# Altium footprint library Miscellaneous THD.PcbLib: 216 footprints (part 5 of 15)
Each footprint in its own frame and in the unit in brackets; x right, y up, seen from the top. Pads: shape width x height; smd on the part's side, far side on the other; paste and mask are expansions set on the pad; w line width, h text height; cw(c..) or ccw(c..) is an arc to the next point about the centre after c.
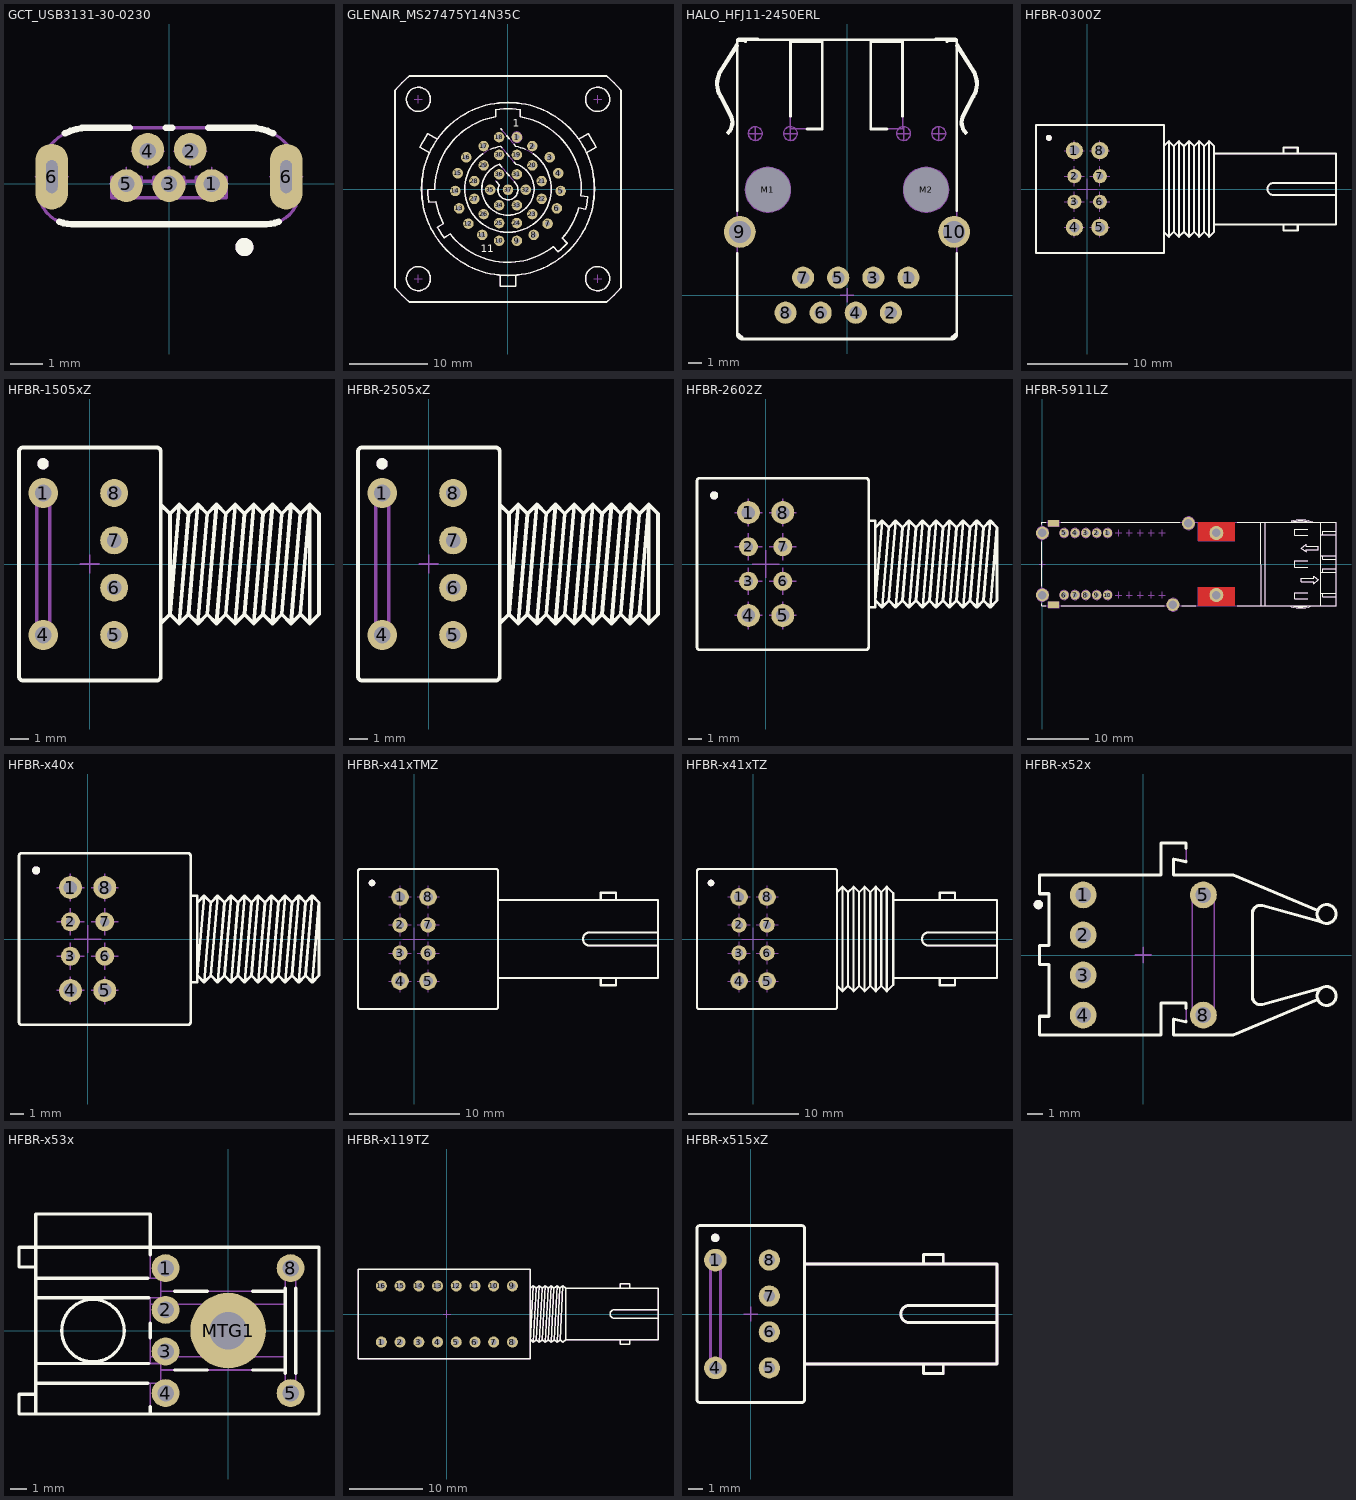
[diagram p4: the footprints below, top view; thin cyan lines are the x and y axes]

## GCT_USB3131-30-0230 [mm] "USB 2.0 Type B Receptacle, Vertical, 5 Contacts, Pins 1.5mm long"
height 5.6
pads (7):
  round 1 hole 0.5 copper offset 0,-0.05: 1(1.3,0) 3(0,0) 5(-1.3,0)
  round 1 hole 0.5 copper offset 0,0.05: 2(0.65,1) 4(-0.65,1)
  oval 1x2 hole 0.35 slot 1 at 90 deg: 6(-3.575,0.22) 6(3.575,0.22)
Top Overlay:
  circle w0.35: c2.3,-1.926 r0.1
  lines w0.2: -3.347,-1.152 ccw(c-2.972,-0.224) -2.972,-1.224 2.971,-1.224 ccw(c2.971,-0.224) 3.346,-1.152 ; -3.176,1.54 cw(c-2.472,0.216) -2.472,1.716 -1.2,1.716 ; -0.1,1.716 0.1,1.716 ; 1.2,1.716 2.471,1.716 cw(c2.471,0.216) 3.176,1.54
Mechanical 8:
  circle w0.05: c-1.3,0 r0.2
  circle w0.05: c0,0 r0.2
  circle w0.05: c1.3,0 r0.2
  circle w0.05: c0.65,1 r0.2
  circle w0.05: c-0.65,1 r0.2
  lines w0.05: -4.075,0.22 -3.575,0.22 ; -3.575,-0.28 -3.575,0.22 ; -3.575,0.72 -3.575,0.22 ; -3.075,0.22 -3.575,0.22 ; -1.8,0 -1.3,0 ; -1.3,-0.5 -1.3,0 ; -1.3,0.5 -1.3,0 ; -1.15,1 -0.65,1 ; -0.8,0 -1.3,0 ; -0.65,0.5 -0.65,1 ; -0.65,1.5 -0.65,1 ; -0.5,0 0,0 ; -0.15,1 -0.65,1 ; 0,-0.5 0,0 ; 0,0.5 0,0 ; 0.15,1 0.65,1 ; 0.5,0 0,0 ; 0.65,0.5 0.65,1 ; 0.65,1.5 0.65,1 ; 0.8,0 1.3,0 ; 1.15,1 0.65,1 ; 1.3,-0.5 1.3,0 ; 1.3,0.5 1.3,0 ; 1.8,0 1.3,0 ; 3.075,0.22 3.575,0.22 ; 3.575,-0.28 3.575,0.22 ; 3.575,0.72 3.575,0.22 ; 4.075,0.22 3.575,0.22 ; -3.75,-0.28 ccw(c-3.575,-0.28) -3.4,-0.28 -3.4,0.72 ccw(c-3.575,0.72) -3.75,0.72 -3.75,-0.28 ; 3.4,-0.28 ccw(c3.575,-0.28) 3.75,-0.28 3.75,0.72 ccw(c3.575,0.72) 3.4,0.72 3.4,-0.28
  lines w0.1: -0.5,0 0,0 ; 0,-0.5 0,0 ; 0,0.5 0,0 ; 0.5,0 0,0
Mechanical 14:
  circle w0.35: c2.3,-1.926 r0.1
  lines w0.1: -3.972,-0.224 ccw(c-2.972,-0.224) -2.972,-1.224 2.971,-1.224 ccw(c2.971,-0.224) 3.971,-0.224 3.971,0.216 ccw(c2.471,0.216) 2.471,1.716 -2.472,1.716 ccw(c-2.472,0.216) -3.972,0.216 -3.972,-0.224 ; -1.75,-0.425 1.75,-0.425 1.75,0.2 1.485,0.2 1.485,0.077 1.113,0.077 1.113,0.2 0.824,0.2 0.824,0.077 0.453,0.077 0.453,0.2 0.188,0.2 0.188,0.077 -0.184,0.077 -0.184,0.2 -0.473,0.2 -0.473,0.077 -0.845,0.077 -0.845,0.2 -1.119,0.2 -1.119,0.077 -1.49,0.077 -1.49,0.2 -1.75,0.2 -1.75,-0.425
3D body "GCT_USB3131-0230.stp": height 5.61, standoff -2.3, extent -3.972,-1.223 3.971,1.709

## GLENAIR_MS27475Y14N35C [mm] "37 Contacts, Wall Mount Hermetic Ultraminiature Circular Receptacle MIL-DTL-38999 Series II"
height 20.85
pads (37):
  round 1.35 hole 0.65: 1(1.143,6.655) 2(3.124,5.512) 3(5.359,4.064) 4(6.452,2.032) 5(6.756,-0.254) 6(6.274,-2.489) 7(5.08,-4.445) 8(3.302,-5.893) 9(1.143,-6.655) 10(-1.143,-6.655) 11(-3.302,-5.893) 12(-5.08,-4.445) 13(-6.274,-2.489) 14(-6.756,-0.254) 15(-6.452,2.032) 16(-5.359,4.064) 17(-3.124,5.512) 18(-1.143,6.655) 19(1.143,4.369) 20(3.124,3.023) 21(4.318,1.016) 22(4.318,-1.27) 23(3.124,-3.226) 24(1.143,-4.369) 25(-1.143,-4.369) 26(-3.124,-3.227) 27(-4.318,-1.27) 28(-4.318,1.016) 29(-3.124,3.023) 30(-1.143,4.369) 31(1.143,1.88) 32(2.286,-0.102) 33(1.143,-2.083) 34(-1.143,-2.083) 35(-2.286,-0.102) 36(-1.143,1.88) 37(0,-0.102)
Top Overlay:
  circle w0.2: c-11.5,-11.5 r1.55
  circle w0.2: c11.5,-11.5 r1.55
  circle w0.2: c11.5,11.5 r1.55
  circle w0.2: c-11.5,11.5 r1.55
  circle w0.2: c0,0 r11.1
  lines w0.2: -10.074,4.661 -11.291,5.364 cw(c0,0) -10.291,7.096 -9.074,6.393 ; -3.231,4.518 ccw(c0,0) 3.231,4.518 ; -2.216,5.093 cw(c0,0) -0.944,5.473 -0.804,5.31 ; -1.482,0.939 -1.126,0.522 ccw(c0,-0.102) 0.965,0.751 ; -1,-11.055 -1,-12.46 ccw(c0,0) 1,-12.46 1,-11.055 ; -0.944,7.748 -0.817,7.6 ; -0.804,2.82 -1.104,3.171 ccw(c0,0) 0.992,3.208 0.804,3.428 ; -0.161,2.068 0.161,1.691 ; -0.161,4.557 0.161,4.181 ; -0.158,6.829 0.164,6.452 ; 0.791,5.719 1.011,5.461 cw(c0,0) 2.216,5.093 ; 0.804,0.939 0.992,0.719 ; 9.074,6.393 10.291,7.096 cw(c0,0) 11.291,5.364 10.074,4.661 ; -14.5,-12.661 ccw(c0,0) -12.661,-14.5 12.661,-14.5 ccw(c0,0) 14.5,-12.661 14.5,12.661 ccw(c0,0) 12.661,14.5 -12.661,14.5 ccw(c0,0) -14.5,12.661 -14.5,-12.661 ; -10.3,-0.098 ccw(c0,0) -10.16,-1.692 -9.261,-1.613 ccw(c0,0) -8.291,-4.43 -9.048,-4.922 ccw(c0,0) -8.176,-6.264 -7.419,-5.772 ccw(c0,0) 5.802,-7.395 6.418,-8.056 ccw(c0,0) 7.588,-6.965 6.973,-6.304 ccw(c0,0) 9.085,-2.414 9.974,-2.571 ccw(c0,0) 10.252,-0.995 9.363,-0.839 ccw(c0,0) 1.6,9.263 1.6,10.175 ccw(c0,0) -1.6,10.175 -1.6,9.263 ccw(c0,0) -9.4,-0.019 -10.3,-0.098
  text "1" at 0.626,7.957 h1
  text "11" at -3.476,-8.104 h1
Mechanical 8:
  drawing of 165 lines, arcs and shapes, not listed
Mechanical 14:
  circle w0.1: c0,0 r11.1
  circle w0.1: c-11.5,-11.5 r1.55
  circle w0.1: c11.5,-11.5 r1.55
  circle w0.1: c11.5,11.5 r1.55
  circle w0.1: c-11.5,11.5 r1.55
  circle w0.1: c1.143,6.655 r0.675
  lines w0.1: -10.074,4.661 -11.291,5.364 cw(c0,0) -10.291,7.096 -9.074,6.393 ; -1.621,1.101 -1.126,0.522 ccw(c0,-0.102) 0.965,0.751 ; -1,-11.055 -1,-12.46 ccw(c0,0) 1,-12.46 1,-11.055 ; -0.944,7.748 1.011,5.461 cw(c0,0) -0.944,5.473 0.992,3.208 cw(c0,0) -1.104,3.171 0.992,0.719 ; 9.074,6.393 10.291,7.096 cw(c0,0) 11.291,5.364 10.074,4.661 ; -14.5,-12.661 ccw(c0,0) -12.661,-14.5 12.662,-14.5 ccw(c0,0) 14.5,-12.661 14.5,12.661 ccw(c0,0) 12.662,14.5 -12.661,14.5 ccw(c0,0) -14.5,12.661 -14.5,-12.661 ; -10.299,-0.098 ccw(c0,0) -10.16,-1.692 -9.26,-1.613 ccw(c0,0) -8.291,-4.43 -9.048,-4.922 ccw(c0,0) -8.176,-6.264 -7.419,-5.772 ccw(c0,0) 5.802,-7.395 6.418,-8.056 ccw(c0,0) 7.588,-6.965 6.973,-6.304 ccw(c0,0) 9.085,-2.414 9.974,-2.571 ccw(c0,0) 10.252,-0.995 9.363,-0.839 ccw(c0,0) 1.6,9.263 1.6,10.175 ccw(c0,0) -1.6,10.175 -1.6,9.263 ccw(c0,0) -9.4,-0.019 -10.299,-0.098
  text "11" at -3.476,-8.104 h1
  text "1" at 0.626,7.957 h1
  text "31" at -0.693,3.169 h1
3D body "GLENAIR_MS27475Y14N35C.stp": height 20.2, standoff -1.27, extent -14.5,-14.5 14.5,14.5

## HALO_HFJ11-2450ERL [mm] "1 Port, 1x1 Tab-Down 10/100BASE-TX RJ45, FastJack Connector Module Without LED"
height 14.72
pads (12):
  round 1.6 hole 0.9: 1(4.445,1.27) 2(3.175,-1.27) 3(1.905,1.27) 4(0.635,-1.27) 5(-0.635,1.27) 6(-1.905,-1.27) 7(-3.175,1.27) 8(-4.445,-1.27)
  round 2.3 hole 1.6: 9(-7.745,4.57) 10(7.745,4.57)
  round 1 hole 3.25 unplated mask+1.125: M1(-5.715,7.62) M2(5.715,7.62)
Top Overlay:
  lines w0.2: -7.94,-2.749 -7.59,-3.02 -7.59,-3.17 ; -7.94,3.032 -7.94,-2.82 ccw(c-7.59,-2.82) -7.59,-3.17 ; -7.94,6.108 -7.94,18.42 -7.33,18.42 ; -7.939,18.188 -9.093,16.376 ccw(c-7.575,15.295) -9.181,14.35 -8.461,12.99 cw(c-9.381,12.499) -8.638,11.767 -8.567,11.696 ccw(c-9.381,12.499) -8.372,13.037 -9.094,14.399 cw(c-7.575,15.295) -9.01,16.32 -7.914,18.042 ; -7.931,18.42 cw(c-7.79,18.37) -7.79,18.52 -6.46,18.52 -6.46,18.47 ; -7.84,-2.827 ccw(c-7.59,-2.82) -7.59,-3.07 ; -7.33,18.32 -7.33,18.52 ; -7.33,18.473 7.23,18.47 ; -4.085,12.93 -4.085,18.32 -1.785,18.32 -1.785,12.021 -2.887,12.021 ; 1.715,18.318 4.015,18.32 4.015,12.928 ; 1.715,18.32 1.715,12.02 2.887,12.02 ; 6.401,18.47 6.401,18.52 7.79,18.52 cw(c7.79,18.37) 7.931,18.42 ; 7.23,18.32 7.23,18.52 ; 7.23,18.42 7.94,18.42 7.94,6.108 ; 7.59,-3.07 ccw(c7.59,-2.82) 7.84,-2.827 ; 7.914,18.042 9.01,16.32 cw(c7.575,15.295) 9.094,14.399 8.372,13.037 ccw(c9.381,12.499) 8.567,11.696 8.638,11.767 cw(c9.381,12.499) 8.461,12.99 9.181,14.35 ccw(c7.575,15.295) 9.093,16.376 7.939,18.188 ; 7.94,-2.749 7.59,-3.02 7.59,-3.17 ; 7.94,3.032 7.94,-2.82 cw(c7.59,-2.82) 7.59,-3.17 ; -7.59,-3.17 7.59,-3.17
Mechanical 8:
  circle w0.1: c-7.745,4.57 r0.8
  circle w0.1: c7.745,4.57 r0.8
  circle w0.1: c5.715,7.62 r1.625
  circle w0.1: c-5.715,7.62 r1.625
  circle w0.1: c-6.63,11.68 r0.5
  circle w0.1: c-4.09,11.68 r0.5
  circle w0.1: c4.09,11.68 r0.5
  circle w0.1: c6.63,11.68 r0.5
  circle w0.1: c4.445,1.27 r0.45
  circle w0.1: c1.905,1.27 r0.45
  circle w0.1: c-0.635,1.27 r0.45
  circle w0.1: c-3.175,1.27 r0.45
  circle w0.1: c3.175,-1.27 r0.45
  circle w0.1: c0.635,-1.27 r0.45
  circle w0.1: c-1.905,-1.27 r0.45
  circle w0.1: c-4.445,-1.27 r0.45
  lines w0.1: -8.245,4.57 -7.745,4.57 ; -7.745,4.07 -7.745,4.57 ; -7.745,5.07 -7.745,4.57 ; -7.245,4.57 -7.745,4.57 ; -7.13,11.68 -6.63,11.68 ; -6.63,11.18 -6.63,11.68 ; -6.63,12.18 -6.63,11.68 ; -6.215,7.62 -5.715,7.62 ; -6.13,11.68 -6.63,11.68 ; -5.715,7.12 -5.715,7.62 ; -5.715,8.12 -5.715,7.62 ; -5.215,7.62 -5.715,7.62 ; -4.945,-1.27 -4.445,-1.27 ; -4.59,11.68 -4.09,11.68 ; -4.445,-1.77 -4.445,-1.27 ; -4.445,-0.77 -4.445,-1.27 ; -4.09,11.18 -4.09,11.68 ; -4.09,12.18 -4.09,11.68 ; -3.945,-1.27 -4.445,-1.27 ; -3.675,1.27 -3.175,1.27 ; -3.59,11.68 -4.09,11.68 ; -3.175,0.77 -3.175,1.27 ; -3.175,1.77 -3.175,1.27 ; -2.675,1.27 -3.175,1.27 ; -2.405,-1.27 -1.905,-1.27 ; -1.905,-1.77 -1.905,-1.27 ; -1.905,-0.77 -1.905,-1.27 ; -1.405,-1.27 -1.905,-1.27 ; -1.135,1.27 -0.635,1.27 ; -0.635,0.77 -0.635,1.27 ; -0.635,1.77 -0.635,1.27 ; -0.5,0 0,0 ; -0.135,1.27 -0.635,1.27 ; 0,-0.5 0,0 ; 0,0.5 0,0 ; 0.135,-1.27 0.635,-1.27 ; 0.5,0 0,0 ; 0.635,-1.77 0.635,-1.27 ; 0.635,-0.77 0.635,-1.27 ; 1.135,-1.27 0.635,-1.27 ; 1.405,1.27 1.905,1.27 ; 1.905,0.77 1.905,1.27 ; 1.905,1.77 1.905,1.27 ; 2.405,1.27 1.905,1.27 ; 2.675,-1.27 3.175,-1.27 ; 3.175,-1.77 3.175,-1.27 ; 3.175,-0.77 3.175,-1.27 ; 3.59,11.68 4.09,11.68 ; 3.675,-1.27 3.175,-1.27 ; 3.945,1.27 4.445,1.27 ; 4.09,11.18 4.09,11.68 ; 4.09,12.18 4.09,11.68 ; 4.445,0.77 4.445,1.27 ; 4.445,1.77 4.445,1.27 ; 4.59,11.68 4.09,11.68 ; 4.945,1.27 4.445,1.27 ; 5.215,7.62 5.715,7.62 ; 5.715,7.12 5.715,7.62 ; 5.715,8.12 5.715,7.62 ; 6.13,11.68 6.63,11.68 ; 6.215,7.62 5.715,7.62 ; 6.63,11.18 6.63,11.68 ; 6.63,12.18 6.63,11.68 ; 7.13,11.68 6.63,11.68 ; 7.245,4.57 7.745,4.57 ; 7.745,4.07 7.745,4.57 ; 7.745,5.07 7.745,4.57 ; 8.245,4.57 7.745,4.57
Mechanical 14:
  lines w0.1: -7.94,-2.749 -7.59,-3.02 -7.59,-3.17 ; -7.939,18.188 -9.093,16.376 ccw(c-7.575,15.295) -9.181,14.35 -8.461,12.99 cw(c-9.381,12.499) -8.638,11.767 -8.567,11.696 ccw(c-9.381,12.499) -8.372,13.037 -9.094,14.399 cw(c-7.575,15.295) -9.01,16.32 -7.914,18.042 ; -7.931,18.42 cw(c-7.79,18.37) -7.79,18.52 -6.46,18.52 -6.46,18.47 ; -7.84,-2.827 ccw(c-7.59,-2.82) -7.59,-3.07 ; -7.33,18.32 -7.33,18.52 ; -7.33,18.42 -7.94,18.42 -7.94,-2.82 ccw(c-7.59,-2.82) -7.59,-3.17 ; -7.33,18.473 7.23,18.47 ; 1.715,18.318 4.015,18.32 4.015,12.02 1.715,12.02 1.715,18.32 ; 6.401,18.47 6.401,18.52 7.79,18.52 cw(c7.79,18.37) 7.931,18.42 ; 7.23,18.32 7.23,18.52 ; 7.23,18.42 7.94,18.42 7.94,-2.82 cw(c7.59,-2.82) 7.59,-3.17 ; 7.59,-3.07 ccw(c7.59,-2.82) 7.84,-2.827 ; 7.914,18.042 9.01,16.32 cw(c7.575,15.295) 9.094,14.399 8.372,13.037 ccw(c9.381,12.499) 8.567,11.696 8.638,11.767 cw(c9.381,12.499) 8.461,12.99 9.181,14.35 ccw(c7.575,15.295) 9.093,16.376 7.939,18.188 ; 7.94,-2.749 7.59,-3.02 7.59,-3.17 ; -7.59,-3.17 7.59,-3.17 ; -4.085,12.021 -1.785,12.021 -1.785,18.32 -4.085,18.32 -4.085,12.021
3D body "HALO_HFJ11-2450ERL.stp": height 15.13, standoff -3.05, extent -9.43,-3.17 9.434,18.52

## HFBR-0300Z [mm] "HFBR-0300Z Series, Fiber Optic Transmitter or Receiver, Through Hole Mount"
height 10.2
pads (8):
  round 1.7 hole 1: 1(-1.27,3.81) 4(-1.27,-3.81) 5(1.27,-3.81) 8(1.27,3.81)
  round 1.4 hole 0.7: 2(-1.27,1.27) 3(-1.27,-1.27) 6(1.27,-1.27) 7(1.27,1.27)
Top Overlay:
  circle w0.3: c-3.81,5.08 r0.15
  lines w0.2: 7.62,-4.25 8.12,-4.75 ; 7.62,4.25 8.12,4.75 ; 12.62,-3.525 24.72,-3.525 ; 12.62,3.525 24.72,3.525 ; 19.52,-3.525 19.52,-4.1 20.92,-4.1 20.92,-3.525 ; 19.52,3.525 19.52,4.1 20.92,4.1 20.92,3.525 ; 24.72,-0.6 18.52,-0.6 cw(c18.52,0) 18.52,0.6 24.72,0.6 ; 8.12,-4.75 8.12,4.75 ; 8.12,-4.75 8.62,-4.25 ; 8.12,4.75 8.62,4.25 ; 8.62,-4.25 8.62,4.25 ; 8.62,-4.25 9.12,-4.75 ; 8.62,4.25 9.12,4.75 ; 9.12,-4.75 9.12,4.75 ; 9.12,-4.75 9.62,-4.25 ; 9.12,4.75 9.62,4.25 ; 9.62,-4.25 9.62,4.25 ; 9.62,-4.25 10.12,-4.75 ; 9.62,4.25 10.12,4.75 ; 10.12,-4.75 10.12,4.75 ; 10.12,-4.75 10.62,-4.25 ; 10.12,4.75 10.62,4.25 ; 10.62,-4.25 10.62,4.25 ; 10.62,-4.25 11.12,-4.75 ; 10.62,4.25 11.12,4.75 ; 11.12,-4.75 11.12,4.75 ; 11.12,-4.75 11.62,-4.25 ; 11.12,4.75 11.62,4.25 ; 11.62,-4.25 11.62,4.25 ; 11.62,-4.25 12.12,-4.75 ; 11.62,4.25 12.12,4.75 ; 12.12,-4.75 12.12,4.75 ; 12.12,-4.75 12.62,-4.25 12.62,4.25 12.12,4.75 ; 24.72,-3.525 24.72,3.525 ; 24.72,-3.525 24.72,3.525 ; -5.08,-6.35 7.62,-6.35 7.62,6.35 -5.08,6.35 -5.08,-6.35
Mechanical 8:
  lines w0.1: -2.27,-3.81 -1.27,-3.81 ; -2.27,-1.27 -1.27,-1.27 ; -2.27,1.27 -1.27,1.27 ; -2.27,3.81 -1.27,3.81 ; -1.27,-4.81 -1.27,-3.81 ; -1.27,-2.81 -1.27,-3.81 ; -1.27,-2.27 -1.27,-1.27 ; -1.27,-0.27 -1.27,-1.27 ; -1.27,0.27 -1.27,1.27 ; -1.27,2.27 -1.27,1.27 ; -1.27,2.81 -1.27,3.81 ; -1.27,4.81 -1.27,3.81 ; -1,0 0,0 ; -0.27,-3.81 -1.27,-3.81 ; -0.27,-1.27 -1.27,-1.27 ; -0.27,1.27 -1.27,1.27 ; -0.27,3.81 -1.27,3.81 ; 0,-1 0,0 ; 0,1 0,0 ; 0.27,-3.81 1.27,-3.81 ; 0.27,-1.27 1.27,-1.27 ; 0.27,1.27 1.27,1.27 ; 0.27,3.81 1.27,3.81 ; 1,0 0,0 ; 1.27,-4.81 1.27,-3.81 ; 1.27,-2.81 1.27,-3.81 ; 1.27,-2.27 1.27,-1.27 ; 1.27,-0.27 1.27,-1.27 ; 1.27,0.27 1.27,1.27 ; 1.27,2.27 1.27,1.27 ; 1.27,2.81 1.27,3.81 ; 1.27,4.81 1.27,3.81 ; 2.27,-3.81 1.27,-3.81 ; 2.27,-1.27 1.27,-1.27 ; 2.27,1.27 1.27,1.27 ; 2.27,3.81 1.27,3.81
Mechanical 14:
  circle w0.3: c-3.81,5.08 r0.15
  lines w0.1: 7.62,-4.25 8.12,-4.75 ; 7.62,4.25 8.12,4.75 ; 12.62,-3.525 24.72,-3.525 24.72,3.525 12.62,3.525 ; 19.52,-3.525 19.52,-4.1 20.92,-4.1 20.92,-3.525 ; 19.52,3.525 19.52,4.1 20.92,4.1 20.92,3.525 ; 24.72,-0.6 18.52,-0.6 cw(c18.52,0) 18.52,0.6 24.72,0.6 ; 8.12,-4.75 8.12,4.75 ; 8.12,-4.75 8.62,-4.25 ; 8.12,4.75 8.62,4.25 ; 8.62,-4.25 8.62,4.25 ; 8.62,-4.25 9.12,-4.75 ; 8.62,4.25 9.12,4.75 ; 9.12,-4.75 9.12,4.75 ; 9.12,-4.75 9.62,-4.25 ; 9.12,4.75 9.62,4.25 ; 9.62,-4.25 9.62,4.25 ; 9.62,-4.25 10.12,-4.75 ; 9.62,4.25 10.12,4.75 ; 10.12,-4.75 10.12,4.75 ; 10.12,-4.75 10.62,-4.25 ; 10.12,4.75 10.62,4.25 ; 10.62,-4.25 10.62,4.25 ; 10.62,-4.25 11.12,-4.75 ; 10.62,4.25 11.12,4.75 ; 11.12,-4.75 11.12,4.75 ; 11.12,-4.75 11.62,-4.25 ; 11.12,4.75 11.62,4.25 ; 11.62,-4.25 11.62,4.25 ; 11.62,-4.25 12.12,-4.75 ; 11.62,4.25 12.12,4.75 ; 12.12,-4.75 12.12,4.75 ; 12.12,-4.75 12.62,-4.25 12.62,4.25 12.12,4.75 ; -5.08,-6.15 ccw(c-4.88,-6.15) -4.88,-6.35 7.42,-6.35 ccw(c7.42,-6.15) 7.62,-6.15 7.62,6.15 ccw(c7.42,6.15) 7.42,6.35 -4.88,6.35 ccw(c-4.88,6.15) -5.08,6.15 -5.08,-6.15
3D body "HFBR-0300Z.stp": height 10.2, standoff -3.6, extent -5.08,-6.35 24.72,6.35

## HFBR-1505xZ [mm] "HFBR-1505xZ Series, SMA Plastic Housed, Fiber Optic Transmitter"
height 10.2
pads (6):
  round 1.6 hole 0.9: 1(-2.5,3.81) 4(-2.5,-3.81)
  round 1.5 hole 0.8: 5(1.31,-3.81) 6(1.31,-1.27) 7(1.31,1.27) 8(1.31,3.81)
Top Overlay:
  circle w0.3: c-2.51,5.38 r0.15
  lines w0.2: 3.8,-3.2 4.3,-2.7 ; 3.8,3.2 4.3,2.7 ; 4.3,-2.7 4.3,2.7 ; 4.3,-2.7 4.8,-3.2 ; 4.3,-2.7 4.8,3.2 ; 4.3,2.7 4.8,3.2 ; 4.8,-3.2 5.3,-2.7 ; 4.8,-3.2 5.3,2.7 ; 4.8,3.2 5.3,2.7 ; 5.3,-2.7 5.8,-3.2 ; 5.3,-2.7 5.8,3.2 ; 5.3,2.7 5.8,3.2 ; 5.8,-3.2 6.3,-2.7 ; 5.8,-3.2 6.3,2.7 ; 5.8,3.2 6.3,2.7 ; 6.3,-2.7 6.8,-3.2 ; 6.3,-2.7 6.8,3.2 ; 6.3,2.7 6.8,3.2 ; 6.8,-3.2 7.3,-2.7 ; 6.8,-3.2 7.3,2.7 ; 6.8,3.2 7.3,2.7 ; 7.3,-2.7 7.8,-3.2 ; 7.3,-2.7 7.8,3.2 ; 7.3,2.7 7.8,3.2 ; 7.8,-3.2 8.3,-2.7 ; 7.8,-3.2 8.3,2.7 ; 7.8,3.2 8.3,2.7 ; 8.3,-2.7 8.8,-3.2 ; 8.3,-2.7 8.8,3.2 ; 8.3,2.7 8.8,3.2 ; 8.8,-3.2 9.3,-2.7 ; 8.8,-3.2 9.3,2.7 ; 8.8,3.2 9.3,2.7 ; 9.3,-2.7 9.8,-3.2 ; 9.3,-2.7 9.8,3.2 ; 9.3,2.7 9.8,3.2 ; 9.8,-3.2 10.3,-2.7 ; 9.8,-3.2 10.3,2.7 ; 9.8,3.2 10.3,2.7 ; 10.3,-2.7 10.8,-3.2 ; 10.3,-2.7 10.8,3.2 ; 10.3,2.7 10.8,3.2 ; 10.8,-3.2 11.3,-2.7 ; 10.8,-3.2 11.3,2.7 ; 10.8,3.2 11.3,2.7 ; 11.3,-2.7 11.8,-3.2 ; 11.3,-2.7 11.8,3.2 ; 11.3,2.7 11.8,3.2 ; 11.8,-3.2 12.3,-2.7 12.3,2.7 11.8,3.2 ; 11.8,-3.2 11.8,3.2 ; -3.8,-6.05 ccw(c-3.6,-6.05) -3.6,-6.25 3.6,-6.25 ccw(c3.6,-6.05) 3.8,-6.05 3.8,6.05 ccw(c3.6,6.05) 3.6,6.25 -3.6,6.25 ccw(c-3.6,6.05) -3.8,6.05 -3.8,-6.05
Mechanical 8:
  lines w0.1: -3,-3.81 -2.5,-3.81 ; -3,3.81 -2.5,3.81 ; -2.5,-4.31 -2.5,-3.81 ; -2.5,-3.31 -2.5,-3.81 ; -2.5,3.31 -2.5,3.81 ; -2.5,4.31 -2.5,3.81 ; -2,-3.81 -2.5,-3.81 ; -2,3.81 -2.5,3.81 ; -0.5,0 0,0 ; 0,-0.5 0,0 ; 0,0.5 0,0 ; 0.5,0 0,0 ; 0.81,-3.81 1.31,-3.81 ; 0.81,-1.27 1.31,-1.27 ; 0.81,1.27 1.31,1.27 ; 0.81,3.81 1.31,3.81 ; 1.31,-4.31 1.31,-3.81 ; 1.31,-3.31 1.31,-3.81 ; 1.31,-1.77 1.31,-1.27 ; 1.31,-0.77 1.31,-1.27 ; 1.31,0.77 1.31,1.27 ; 1.31,1.77 1.31,1.27 ; 1.31,3.31 1.31,3.81 ; 1.31,4.31 1.31,3.81 ; 1.81,-3.81 1.31,-3.81 ; 1.81,-1.27 1.31,-1.27 ; 1.81,1.27 1.31,1.27 ; 1.81,3.81 1.31,3.81
Mechanical 14:
  circle w0.3: c-2.51,5.38 r0.15
  lines w0.1: 3.8,-3.2 4.3,-2.7 ; 3.8,3.2 4.3,2.7 ; 4.3,-2.7 4.3,2.7 ; 4.3,-2.7 4.8,-3.2 ; 4.3,-2.7 4.8,3.2 ; 4.3,2.7 4.8,3.2 ; 4.8,-3.2 5.3,-2.7 ; 4.8,-3.2 5.3,2.7 ; 4.8,3.2 5.3,2.7 ; 5.3,-2.7 5.8,-3.2 ; 5.3,-2.7 5.8,3.2 ; 5.3,2.7 5.8,3.2 ; 5.8,-3.2 6.3,-2.7 ; 5.8,-3.2 6.3,2.7 ; 5.8,3.2 6.3,2.7 ; 6.3,-2.7 6.8,-3.2 ; 6.3,-2.7 6.8,3.2 ; 6.3,2.7 6.8,3.2 ; 6.8,-3.2 7.3,-2.7 ; 6.8,-3.2 7.3,2.7 ; 6.8,3.2 7.3,2.7 ; 7.3,-2.7 7.8,-3.2 ; 7.3,-2.7 7.8,3.2 ; 7.3,2.7 7.8,3.2 ; 7.8,-3.2 8.3,-2.7 ; 7.8,-3.2 8.3,2.7 ; 7.8,3.2 8.3,2.7 ; 8.3,-2.7 8.8,-3.2 ; 8.3,-2.7 8.8,3.2 ; 8.3,2.7 8.8,3.2 ; 8.8,-3.2 9.3,-2.7 ; 8.8,-3.2 9.3,2.7 ; 8.8,3.2 9.3,2.7 ; 9.3,-2.7 9.8,-3.2 ; 9.3,-2.7 9.8,3.2 ; 9.3,2.7 9.8,3.2 ; 9.8,-3.2 10.3,-2.7 ; 9.8,-3.2 10.3,2.7 ; 9.8,3.2 10.3,2.7 ; 10.3,-2.7 10.8,-3.2 ; 10.3,-2.7 10.8,3.2 ; 10.3,2.7 10.8,3.2 ; 10.8,-3.2 11.3,-2.7 ; 10.8,-3.2 11.3,2.7 ; 10.8,3.2 11.3,2.7 ; 11.3,-2.7 11.8,-3.2 ; 11.3,-2.7 11.8,3.2 ; 11.3,2.7 11.8,3.2 ; 11.8,-3.2 12.3,-2.7 12.3,2.7 11.8,3.2 ; 11.8,-3.2 11.8,3.2 ; -3.8,-6.05 ccw(c-3.6,-6.05) -3.6,-6.25 3.6,-6.25 ccw(c3.6,-6.05) 3.8,-6.05 3.8,6.05 ccw(c3.6,6.05) 3.6,6.25 -3.6,6.25 ccw(c-3.6,6.05) -3.8,6.05 -3.8,-6.05 ; -2.9,-4.25 -2.9,4.25 -2.1,4.25 -2.1,-4.25 -2.9,-4.25 ; -2.8,-3.81 ccw(c-2.5,-3.81) -2.2,-3.81 -2.2,3.81 ccw(c-2.5,3.81) -2.8,3.81 -2.8,-3.81
3D body "HFBR-1505xZ.stp": height 10.2, standoff -2.8, extent -3.8,-6.249 12.3,6.249

## HFBR-2505xZ [mm] "HFBR-2505xZ Series, SMA Plastic Housed, Fiber Optic Receiver"
height 10.2
pads (6):
  round 1.6 hole 0.9: 1(-2.5,3.81) 4(-2.5,-3.81)
  round 1.5 hole 0.8: 5(1.31,-3.81) 6(1.31,-1.27) 7(1.31,1.27) 8(1.31,3.81)
Top Overlay:
  circle w0.3: c-2.51,5.38 r0.15
  lines w0.2: 3.8,-3.2 4.3,-2.7 ; 3.8,3.2 4.3,2.7 ; 4.3,-2.7 4.3,2.7 ; 4.3,-2.7 4.8,-3.2 ; 4.3,-2.7 4.8,3.2 ; 4.3,2.7 4.8,3.2 ; 4.8,-3.2 5.3,-2.7 ; 4.8,-3.2 5.3,2.7 ; 4.8,3.2 5.3,2.7 ; 5.3,-2.7 5.8,-3.2 ; 5.3,-2.7 5.8,3.2 ; 5.3,2.7 5.8,3.2 ; 5.8,-3.2 6.3,-2.7 ; 5.8,-3.2 6.3,2.7 ; 5.8,3.2 6.3,2.7 ; 6.3,-2.7 6.8,-3.2 ; 6.3,-2.7 6.8,3.2 ; 6.3,2.7 6.8,3.2 ; 6.8,-3.2 7.3,-2.7 ; 6.8,-3.2 7.3,2.7 ; 6.8,3.2 7.3,2.7 ; 7.3,-2.7 7.8,-3.2 ; 7.3,-2.7 7.8,3.2 ; 7.3,2.7 7.8,3.2 ; 7.8,-3.2 8.3,-2.7 ; 7.8,-3.2 8.3,2.7 ; 7.8,3.2 8.3,2.7 ; 8.3,-2.7 8.8,-3.2 ; 8.3,-2.7 8.8,3.2 ; 8.3,2.7 8.8,3.2 ; 8.8,-3.2 9.3,-2.7 ; 8.8,-3.2 9.3,2.7 ; 8.8,3.2 9.3,2.7 ; 9.3,-2.7 9.8,-3.2 ; 9.3,-2.7 9.8,3.2 ; 9.3,2.7 9.8,3.2 ; 9.8,-3.2 10.3,-2.7 ; 9.8,-3.2 10.3,2.7 ; 9.8,3.2 10.3,2.7 ; 10.3,-2.7 10.8,-3.2 ; 10.3,-2.7 10.8,3.2 ; 10.3,2.7 10.8,3.2 ; 10.8,-3.2 11.3,-2.7 ; 10.8,-3.2 11.3,2.7 ; 10.8,3.2 11.3,2.7 ; 11.3,-2.7 11.8,-3.2 ; 11.3,-2.7 11.8,3.2 ; 11.3,2.7 11.8,3.2 ; 11.8,-3.2 12.3,-2.7 12.3,2.7 11.8,3.2 ; 11.8,-3.2 11.8,3.2 ; -3.8,-6.05 ccw(c-3.6,-6.05) -3.6,-6.25 3.6,-6.25 ccw(c3.6,-6.05) 3.8,-6.05 3.8,6.05 ccw(c3.6,6.05) 3.6,6.25 -3.6,6.25 ccw(c-3.6,6.05) -3.8,6.05 -3.8,-6.05
Mechanical 8:
  lines w0.1: -3,-3.81 -2.5,-3.81 ; -3,3.81 -2.5,3.81 ; -2.5,-4.31 -2.5,-3.81 ; -2.5,-3.31 -2.5,-3.81 ; -2.5,3.31 -2.5,3.81 ; -2.5,4.31 -2.5,3.81 ; -2,-3.81 -2.5,-3.81 ; -2,3.81 -2.5,3.81 ; -0.5,0 0,0 ; 0,-0.5 0,0 ; 0,0.5 0,0 ; 0.5,0 0,0 ; 0.81,-3.81 1.31,-3.81 ; 0.81,-1.27 1.31,-1.27 ; 0.81,1.27 1.31,1.27 ; 0.81,3.81 1.31,3.81 ; 1.31,-4.31 1.31,-3.81 ; 1.31,-3.31 1.31,-3.81 ; 1.31,-1.77 1.31,-1.27 ; 1.31,-0.77 1.31,-1.27 ; 1.31,0.77 1.31,1.27 ; 1.31,1.77 1.31,1.27 ; 1.31,3.31 1.31,3.81 ; 1.31,4.31 1.31,3.81 ; 1.81,-3.81 1.31,-3.81 ; 1.81,-1.27 1.31,-1.27 ; 1.81,1.27 1.31,1.27 ; 1.81,3.81 1.31,3.81
Mechanical 14:
  circle w0.3: c-2.51,5.38 r0.15
  lines w0.1: 3.8,-3.2 4.3,-2.7 ; 3.8,3.2 4.3,2.7 ; 4.3,-2.7 4.3,2.7 ; 4.3,-2.7 4.8,-3.2 ; 4.3,-2.7 4.8,3.2 ; 4.3,2.7 4.8,3.2 ; 4.8,-3.2 5.3,-2.7 ; 4.8,-3.2 5.3,2.7 ; 4.8,3.2 5.3,2.7 ; 5.3,-2.7 5.8,-3.2 ; 5.3,-2.7 5.8,3.2 ; 5.3,2.7 5.8,3.2 ; 5.8,-3.2 6.3,-2.7 ; 5.8,-3.2 6.3,2.7 ; 5.8,3.2 6.3,2.7 ; 6.3,-2.7 6.8,-3.2 ; 6.3,-2.7 6.8,3.2 ; 6.3,2.7 6.8,3.2 ; 6.8,-3.2 7.3,-2.7 ; 6.8,-3.2 7.3,2.7 ; 6.8,3.2 7.3,2.7 ; 7.3,-2.7 7.8,-3.2 ; 7.3,-2.7 7.8,3.2 ; 7.3,2.7 7.8,3.2 ; 7.8,-3.2 8.3,-2.7 ; 7.8,-3.2 8.3,2.7 ; 7.8,3.2 8.3,2.7 ; 8.3,-2.7 8.8,-3.2 ; 8.3,-2.7 8.8,3.2 ; 8.3,2.7 8.8,3.2 ; 8.8,-3.2 9.3,-2.7 ; 8.8,-3.2 9.3,2.7 ; 8.8,3.2 9.3,2.7 ; 9.3,-2.7 9.8,-3.2 ; 9.3,-2.7 9.8,3.2 ; 9.3,2.7 9.8,3.2 ; 9.8,-3.2 10.3,-2.7 ; 9.8,-3.2 10.3,2.7 ; 9.8,3.2 10.3,2.7 ; 10.3,-2.7 10.8,-3.2 ; 10.3,-2.7 10.8,3.2 ; 10.3,2.7 10.8,3.2 ; 10.8,-3.2 11.3,-2.7 ; 10.8,-3.2 11.3,2.7 ; 10.8,3.2 11.3,2.7 ; 11.3,-2.7 11.8,-3.2 ; 11.3,-2.7 11.8,3.2 ; 11.3,2.7 11.8,3.2 ; 11.8,-3.2 12.3,-2.7 12.3,2.7 11.8,3.2 ; 11.8,-3.2 11.8,3.2 ; -3.8,-6.05 ccw(c-3.6,-6.05) -3.6,-6.25 3.6,-6.25 ccw(c3.6,-6.05) 3.8,-6.05 3.8,6.05 ccw(c3.6,6.05) 3.6,6.25 -3.6,6.25 ccw(c-3.6,6.05) -3.8,6.05 -3.8,-6.05 ; -2.9,-4.25 -2.9,4.25 -2.1,4.25 -2.1,-4.25 -2.9,-4.25 ; -2.8,-3.81 ccw(c-2.5,-3.81) -2.2,-3.81 -2.2,3.81 ccw(c-2.5,3.81) -2.8,3.81 -2.8,-3.81
3D body "HFBR-2505xZ.stp": height 10.2, standoff -2.8, extent -3.8,-6.249 12.3,6.249
